# Altium footprint library ref-packages-longpad.PCBLIB: 1527 footprints (part 75 of 103) (continued)
## SQFP-S-7X7-72 [mm]
pads (72):
  rect 0.17x1.6 smd: 1(-2.55,-4.1) 2(-2.25,-4.1) 3(-1.95,-4.1) 4(-1.65,-4.1) 5(-1.35,-4.1) 6(-1.05,-4.1) 7(-0.75,-4.1) 8(-0.45,-4.1) 9(-0.15,-4.1) 10(0.15,-4.1) 11(0.45,-4.1) 12(0.75,-4.1) 13(1.05,-4.1) 14(1.35,-4.1) 15(1.65,-4.1) 16(1.95,-4.1) 17(2.25,-4.1) 18(2.55,-4.1) 37(2.55,4.1) 38(2.25,4.1) 39(1.95,4.1) 40(1.65,4.1) 41(1.35,4.1) 42(1.05,4.1) 43(0.75,4.1) 44(0.45,4.1) 45(0.15,4.1) 46(-0.15,4.1) 47(-0.45,4.1) 48(-0.75,4.1) 49(-1.05,4.1) 50(-1.35,4.1) 51(-1.65,4.1) 52(-1.95,4.1) 53(-2.25,4.1) 54(-2.55,4.1)
  rect 1.6x0.17 smd: 19(4.1,-2.55) 20(4.1,-2.25) 21(4.1,-1.95) 22(4.1,-1.65) 23(4.1,-1.35) 24(4.1,-1.05) 25(4.1,-0.75) 26(4.1,-0.45) 27(4.1,-0.15) 28(4.1,0.15) 29(4.1,0.45) 30(4.1,0.75) 31(4.1,1.05) 32(4.1,1.35) 33(4.1,1.65) 34(4.1,1.95) 35(4.1,2.25) 36(4.1,2.55) 55(-4.1,2.55) 56(-4.1,2.25) 57(-4.1,1.95) 58(-4.1,1.65) 59(-4.1,1.35) 60(-4.1,1.05) 61(-4.1,0.75) 62(-4.1,0.45) 63(-4.1,0.15) 64(-4.1,-0.15) 65(-4.1,-0.45) 66(-4.1,-0.75) 67(-4.1,-1.05) 68(-4.1,-1.35) 69(-4.1,-1.65) 70(-4.1,-1.95) 71(-4.1,-2.25) 72(-4.1,-2.55)
Top Overlay:
  circle w0.254: c-2.25,-2.25 r0.5
  lines w0.203: -3.2,-3.2 3.2,-3.2 3.2,3.2 -3.2,3.2 -3.2,-3.2
Mechanical 16:
  rectangle: -2.62,-4.6 -2.48,-3.45
  rectangle: -2.32,-4.6 -2.18,-3.45
  rectangle: -2.02,-4.6 -1.88,-3.45
  rectangle: -1.72,-4.6 -1.58,-3.45
  rectangle: -1.42,-4.6 -1.28,-3.45
  rectangle: -1.12,-4.6 -0.98,-3.45
  rectangle: -0.82,-4.6 -0.68,-3.45
  rectangle: -0.52,-4.6 -0.38,-3.45
  rectangle: -0.22,-4.6 -0.08,-3.45
  rectangle: 0.08,-4.6 0.22,-3.45
  rectangle: 0.38,-4.6 0.52,-3.45
  rectangle: 0.68,-4.6 0.82,-3.45
  rectangle: 0.98,-4.6 1.12,-3.45
  rectangle: 1.28,-4.6 1.42,-3.45
  rectangle: 1.58,-4.6 1.72,-3.45
  rectangle: 1.88,-4.6 2.02,-3.45
  rectangle: 2.18,-4.6 2.32,-3.45
  rectangle: 2.48,-4.6 2.62,-3.45
  rectangle: 3.45,-2.62 4.6,-2.48
  rectangle: 3.45,-2.32 4.6,-2.18
  rectangle: 3.45,-2.02 4.6,-1.88
  rectangle: 3.45,-1.72 4.6,-1.58
  rectangle: 3.45,-1.42 4.6,-1.28
  rectangle: 3.45,-1.12 4.6,-0.98
  rectangle: 3.45,-0.82 4.6,-0.68
  rectangle: 3.45,-0.52 4.6,-0.38
  rectangle: 3.45,-0.22 4.6,-0.08
  rectangle: 3.45,0.08 4.6,0.22
  rectangle: 3.45,0.38 4.6,0.52
  rectangle: 3.45,0.68 4.6,0.82
  rectangle: 3.45,0.98 4.6,1.12
  rectangle: 3.45,1.28 4.6,1.42
  rectangle: 3.45,1.58 4.6,1.72
  rectangle: 3.45,1.88 4.6,2.02
  rectangle: 3.45,2.18 4.6,2.32
  rectangle: 3.45,2.48 4.6,2.62
  rectangle: 2.48,3.45 2.62,4.6
  rectangle: 2.18,3.45 2.32,4.6
  rectangle: 1.88,3.45 2.02,4.6
  rectangle: 1.58,3.45 1.72,4.6
  rectangle: 1.28,3.45 1.42,4.6
  rectangle: 0.98,3.45 1.12,4.6
  rectangle: 0.68,3.45 0.82,4.6
  rectangle: 0.38,3.45 0.52,4.6
  rectangle: 0.08,3.45 0.22,4.6
  rectangle: -0.22,3.45 -0.08,4.6
  rectangle: -0.52,3.45 -0.38,4.6
  rectangle: -0.82,3.45 -0.68,4.6
  rectangle: -1.12,3.45 -0.98,4.6
  rectangle: -1.42,3.45 -1.28,4.6
  rectangle: -1.72,3.45 -1.58,4.6
  rectangle: -2.02,3.45 -1.88,4.6
  rectangle: -2.32,3.45 -2.18,4.6
  rectangle: -2.62,3.45 -2.48,4.6
  rectangle: -4.6,2.48 -3.45,2.62
  rectangle: -4.6,2.18 -3.45,2.32
  rectangle: -4.6,1.88 -3.45,2.02
  rectangle: -4.6,1.58 -3.45,1.72
  rectangle: -4.6,1.28 -3.45,1.42
  rectangle: -4.6,0.98 -3.45,1.12
  rectangle: -4.6,0.68 -3.45,0.82
  rectangle: -4.6,0.38 -3.45,0.52
  rectangle: -4.6,0.08 -3.45,0.22
  rectangle: -4.6,-0.22 -3.45,-0.08
  rectangle: -4.6,-0.52 -3.45,-0.38
  rectangle: -4.6,-0.82 -3.45,-0.68
  rectangle: -4.6,-1.12 -3.45,-0.98
  rectangle: -4.6,-1.42 -3.45,-1.28
  rectangle: -4.6,-1.72 -3.45,-1.58
  rectangle: -4.6,-2.02 -3.45,-1.88
  rectangle: -4.6,-2.32 -3.45,-2.18
  rectangle: -4.6,-2.62 -3.45,-2.48
  lines w0.203: -3.4,-3.4 3.4,-3.4 3.4,3.4 -3.4,3.4 -3.4,-3.4
Mechanical 27:
  lines w0.2: -5.4,-5.4 -5.4,5.4 5.4,5.4 5.4,-5.4 -5.4,-5.4

## SQFP-S-7X7-80 [mm]
pads (80):
  rect 0.17x1.6 smd: 1(-2.85,-4.1) 2(-2.55,-4.1) 3(-2.25,-4.1) 4(-1.95,-4.1) 5(-1.65,-4.1) 6(-1.35,-4.1) 7(-1.05,-4.1) 8(-0.75,-4.1) 9(-0.45,-4.1) 10(-0.15,-4.1) 11(0.15,-4.1) 12(0.45,-4.1) 13(0.75,-4.1) 14(1.05,-4.1) 15(1.35,-4.1) 16(1.65,-4.1) 17(1.95,-4.1) 18(2.25,-4.1) 19(2.55,-4.1) 20(2.85,-4.1) 41(2.85,4.1) 42(2.55,4.1) 43(2.25,4.1) 44(1.95,4.1) 45(1.65,4.1) 46(1.35,4.1) 47(1.05,4.1) 48(0.75,4.1) 49(0.45,4.1) 50(0.15,4.1) 51(-0.15,4.1) 52(-0.45,4.1) 53(-0.75,4.1) 54(-1.05,4.1) 55(-1.35,4.1) 56(-1.65,4.1) 57(-1.95,4.1) 58(-2.25,4.1) 59(-2.55,4.1) 60(-2.85,4.1)
  rect 1.6x0.17 smd: 21(4.1,-2.85) 22(4.1,-2.55) 23(4.1,-2.25) 24(4.1,-1.95) 25(4.1,-1.65) 26(4.1,-1.35) 27(4.1,-1.05) 28(4.1,-0.75) 29(4.1,-0.45) 30(4.1,-0.15) 31(4.1,0.15) 32(4.1,0.45) 33(4.1,0.75) 34(4.1,1.05) 35(4.1,1.35) 36(4.1,1.65) 37(4.1,1.95) 38(4.1,2.25) 39(4.1,2.55) 40(4.1,2.85) 61(-4.1,2.85) 62(-4.1,2.55) 63(-4.1,2.25) 64(-4.1,1.95) 65(-4.1,1.65) 66(-4.1,1.35) 67(-4.1,1.05) 68(-4.1,0.75) 69(-4.1,0.45) 70(-4.1,0.15) 71(-4.1,-0.15) 72(-4.1,-0.45) 73(-4.1,-0.75) 74(-4.1,-1.05) 75(-4.1,-1.35) 76(-4.1,-1.65) 77(-4.1,-1.95) 78(-4.1,-2.25) 79(-4.1,-2.55) 80(-4.1,-2.85)
Top Overlay:
  circle w0.254: c-2.25,-2.25 r0.5
  lines w0.203: -3.2,-3.2 3.2,-3.2 3.2,3.2 -3.2,3.2 -3.2,-3.2
Mechanical 16:
  rectangle: -2.92,-4.6 -2.78,-3.45
  rectangle: -2.62,-4.6 -2.48,-3.45
  rectangle: -2.32,-4.6 -2.18,-3.45
  rectangle: -2.02,-4.6 -1.88,-3.45
  rectangle: -1.72,-4.6 -1.58,-3.45
  rectangle: -1.42,-4.6 -1.28,-3.45
  rectangle: -1.12,-4.6 -0.98,-3.45
  rectangle: -0.82,-4.6 -0.68,-3.45
  rectangle: -0.52,-4.6 -0.38,-3.45
  rectangle: -0.22,-4.6 -0.08,-3.45
  rectangle: 0.08,-4.6 0.22,-3.45
  rectangle: 0.38,-4.6 0.52,-3.45
  rectangle: 0.68,-4.6 0.82,-3.45
  rectangle: 0.98,-4.6 1.12,-3.45
  rectangle: 1.28,-4.6 1.42,-3.45
  rectangle: 1.58,-4.6 1.72,-3.45
  rectangle: 1.88,-4.6 2.02,-3.45
  rectangle: 2.18,-4.6 2.32,-3.45
  rectangle: 2.48,-4.6 2.62,-3.45
  rectangle: 2.78,-4.6 2.92,-3.45
  rectangle: 3.45,-2.92 4.6,-2.78
  rectangle: 3.45,-2.62 4.6,-2.48
  rectangle: 3.45,-2.32 4.6,-2.18
  rectangle: 3.45,-2.02 4.6,-1.88
  rectangle: 3.45,-1.72 4.6,-1.58
  rectangle: 3.45,-1.42 4.6,-1.28
  rectangle: 3.45,-1.12 4.6,-0.98
  rectangle: 3.45,-0.82 4.6,-0.68
  rectangle: 3.45,-0.52 4.6,-0.38
  rectangle: 3.45,-0.22 4.6,-0.08
  rectangle: 3.45,0.08 4.6,0.22
  rectangle: 3.45,0.38 4.6,0.52
  rectangle: 3.45,0.68 4.6,0.82
  rectangle: 3.45,0.98 4.6,1.12
  rectangle: 3.45,1.28 4.6,1.42
  rectangle: 3.45,1.58 4.6,1.72
  rectangle: 3.45,1.88 4.6,2.02
  rectangle: 3.45,2.18 4.6,2.32
  rectangle: 3.45,2.48 4.6,2.62
  rectangle: 3.45,2.78 4.6,2.92
  rectangle: 2.78,3.45 2.92,4.6
  rectangle: 2.48,3.45 2.62,4.6
  rectangle: 2.18,3.45 2.32,4.6
  rectangle: 1.88,3.45 2.02,4.6
  rectangle: 1.58,3.45 1.72,4.6
  rectangle: 1.28,3.45 1.42,4.6
  rectangle: 0.98,3.45 1.12,4.6
  rectangle: 0.68,3.45 0.82,4.6
  rectangle: 0.38,3.45 0.52,4.6
  rectangle: 0.08,3.45 0.22,4.6
  rectangle: -0.22,3.45 -0.08,4.6
  rectangle: -0.52,3.45 -0.38,4.6
  rectangle: -0.82,3.45 -0.68,4.6
  rectangle: -1.12,3.45 -0.98,4.6
  rectangle: -1.42,3.45 -1.28,4.6
  rectangle: -1.72,3.45 -1.58,4.6
  rectangle: -2.02,3.45 -1.88,4.6
  rectangle: -2.32,3.45 -2.18,4.6
  rectangle: -2.62,3.45 -2.48,4.6
  rectangle: -2.92,3.45 -2.78,4.6
  rectangle: -4.6,2.78 -3.45,2.92
  rectangle: -4.6,2.48 -3.45,2.62
  rectangle: -4.6,2.18 -3.45,2.32
  rectangle: -4.6,1.88 -3.45,2.02
  rectangle: -4.6,1.58 -3.45,1.72
  rectangle: -4.6,1.28 -3.45,1.42
  rectangle: -4.6,0.98 -3.45,1.12
  rectangle: -4.6,0.68 -3.45,0.82
  rectangle: -4.6,0.38 -3.45,0.52
  rectangle: -4.6,0.08 -3.45,0.22
  rectangle: -4.6,-0.22 -3.45,-0.08
  rectangle: -4.6,-0.52 -3.45,-0.38
  rectangle: -4.6,-0.82 -3.45,-0.68
  rectangle: -4.6,-1.12 -3.45,-0.98
  rectangle: -4.6,-1.42 -3.45,-1.28
  rectangle: -4.6,-1.72 -3.45,-1.58
  rectangle: -4.6,-2.02 -3.45,-1.88
  rectangle: -4.6,-2.32 -3.45,-2.18
  rectangle: -4.6,-2.62 -3.45,-2.48
  rectangle: -4.6,-2.92 -3.45,-2.78
  lines w0.203: -3.4,-3.4 3.4,-3.4 3.4,3.4 -3.4,3.4 -3.4,-3.4
Mechanical 27:
  lines w0.2: -5.4,-5.4 -5.4,5.4 5.4,5.4 5.4,-5.4 -5.4,-5.4

## SQFP-S-10X10-44 [mm]
pads (44):
  rect 0.5x1.8 smd: 1(-4,-6) 2(-3.2,-6) 3(-2.4,-6) 4(-1.6,-6) 5(-0.8,-6) 6(0,-6) 7(0.8,-6) 8(1.6,-6) 9(2.4,-6) 10(3.2,-6) 11(4,-6) 23(4,6) 24(3.2,6) 25(2.4,6) 26(1.6,6) 27(0.8,6) 28(0,6) 29(-0.8,6) 30(-1.6,6) 31(-2.4,6) 32(-3.2,6) 33(-4,6)
  rect 1.8x0.5 smd: 12(6,-4) 13(6,-3.2) 14(6,-2.4) 15(6,-1.6) 16(6,-0.8) 17(6,0) 18(6,0.8) 19(6,1.6) 20(6,2.4) 21(6,3.2) 22(6,4) 34(-6,4) 35(-6,3.2) 36(-6,2.4) 37(-6,1.6) 38(-6,0.8) 39(-6,0) 40(-6,-0.8) 41(-6,-1.6) 42(-6,-2.4) 43(-6,-3.2) 44(-6,-4)
Top Overlay:
  circle w0.254: c-3.75,-3.75 r0.5
  lines w0.203: -4.72,-4.71 4.71,-4.71 4.71,4.71 -4.72,4.71 -4.72,-4.71
Mechanical 16:
  rectangle: -4.22,-6.72 -3.78,-4.95
  rectangle: -3.42,-6.72 -2.98,-4.95
  rectangle: -2.62,-6.72 -2.18,-4.95
  rectangle: -1.82,-6.72 -1.38,-4.95
  rectangle: -1.02,-6.72 -0.58,-4.95
  rectangle: -0.22,-6.72 0.22,-4.95
  rectangle: 0.58,-6.72 1.02,-4.95
  rectangle: 1.38,-6.72 1.82,-4.95
  rectangle: 2.18,-6.72 2.62,-4.95
  rectangle: 2.98,-6.72 3.42,-4.95
  rectangle: 3.78,-6.72 4.22,-4.95
  rectangle: 4.95,-4.22 6.72,-3.78
  rectangle: 4.95,-3.42 6.72,-2.98
  rectangle: 4.95,-2.62 6.72,-2.18
  rectangle: 4.95,-1.82 6.72,-1.38
  rectangle: 4.95,-1.02 6.72,-0.58
  rectangle: 4.95,-0.22 6.72,0.22
  rectangle: 4.95,0.58 6.72,1.02
  rectangle: 4.95,1.38 6.72,1.82
  rectangle: 4.95,2.18 6.72,2.62
  rectangle: 4.95,2.98 6.72,3.42
  rectangle: 4.95,3.78 6.72,4.22
  rectangle: 3.78,4.95 4.22,6.72
  rectangle: 2.98,4.95 3.42,6.72
  rectangle: 2.18,4.95 2.62,6.72
  rectangle: 1.38,4.95 1.82,6.72
  rectangle: 0.58,4.95 1.02,6.72
  rectangle: -0.22,4.95 0.22,6.72
  rectangle: -1.02,4.95 -0.58,6.72
  rectangle: -1.82,4.95 -1.38,6.72
  rectangle: -2.62,4.95 -2.18,6.72
  rectangle: -3.42,4.95 -2.98,6.72
  rectangle: -4.22,4.95 -3.78,6.72
  rectangle: -6.72,3.78 -4.95,4.22
  rectangle: -6.72,2.98 -4.95,3.42
  rectangle: -6.72,2.18 -4.95,2.62
  rectangle: -6.72,1.38 -4.95,1.82
  rectangle: -6.72,0.58 -4.95,1.02
  rectangle: -6.72,-0.22 -4.95,0.22
  rectangle: -6.72,-1.02 -4.95,-0.58
  rectangle: -6.72,-1.82 -4.95,-1.38
  rectangle: -6.72,-2.62 -4.95,-2.18
  rectangle: -6.72,-3.42 -4.95,-2.98
  rectangle: -6.72,-4.22 -4.95,-3.78
  lines w0.203: -4.91,-4.91 4.91,-4.91 4.91,4.91 -4.91,4.91 -4.91,-4.91
Mechanical 27:
  lines w0.2: -7.4,-7.4 -7.4,7.4 7.4,7.4 7.4,-7.4 -7.4,-7.4

## SQFP-S-10X10-52 [mm]
pads (52):
  rect 0.4x1.8 smd: 1(-3.9,-6) 2(-3.25,-6) 3(-2.6,-6) 4(-1.95,-6) 5(-1.3,-6) 6(-0.65,-6) 7(0,-6) 8(0.65,-6) 9(1.3,-6) 10(1.95,-6) 11(2.6,-6) 12(3.25,-6) 13(3.9,-6) 27(3.9,6) 28(3.25,6) 29(2.6,6) 30(1.95,6) 31(1.3,6) 32(0.65,6) 33(0,6) 34(-0.65,6) 35(-1.3,6) 36(-1.95,6) 37(-2.6,6) 38(-3.25,6) 39(-3.9,6)
  rect 1.8x0.4 smd: 14(6,-3.9) 15(6,-3.25) 16(6,-2.6) 17(6,-1.95) 18(6,-1.3) 19(6,-0.65) 20(6,0) 21(6,0.65) 22(6,1.3) 23(6,1.95) 24(6,2.6) 25(6,3.25) 26(6,3.9) 40(-6,3.9) 41(-6,3.25) 42(-6,2.6) 43(-6,1.95) 44(-6,1.3) 45(-6,0.65) 46(-6,0) 47(-6,-0.65) 48(-6,-1.3) 49(-6,-1.95) 50(-6,-2.6) 51(-6,-3.25) 52(-6,-3.9)
Top Overlay:
  circle w0.254: c-3.75,-3.75 r0.5
  lines w0.203: -4.72,-4.71 4.71,-4.71 4.71,4.71 -4.72,4.71 -4.72,-4.71
Mechanical 16:
  rectangle: -4.09,-6.72 -3.71,-4.95
  rectangle: -3.44,-6.72 -3.06,-4.95
  rectangle: -2.79,-6.72 -2.41,-4.95
  rectangle: -2.14,-6.72 -1.76,-4.95
  rectangle: -1.49,-6.72 -1.11,-4.95
  rectangle: -0.84,-6.72 -0.46,-4.95
  rectangle: -0.19,-6.72 0.19,-4.95
  rectangle: 0.46,-6.72 0.84,-4.95
  rectangle: 1.11,-6.72 1.49,-4.95
  rectangle: 1.76,-6.72 2.14,-4.95
  rectangle: 2.41,-6.72 2.79,-4.95
  rectangle: 3.06,-6.72 3.44,-4.95
  rectangle: 3.71,-6.72 4.09,-4.95
  rectangle: 4.95,-4.09 6.72,-3.71
  rectangle: 4.95,-3.44 6.72,-3.06
  rectangle: 4.95,-2.79 6.72,-2.41
  rectangle: 4.95,-2.14 6.72,-1.76
  rectangle: 4.95,-1.49 6.72,-1.11
  rectangle: 4.95,-0.84 6.72,-0.46
  rectangle: 4.95,-0.19 6.72,0.19
  rectangle: 4.95,0.46 6.72,0.84
  rectangle: 4.95,1.11 6.72,1.49
  rectangle: 4.95,1.76 6.72,2.14
  rectangle: 4.95,2.41 6.72,2.79
  rectangle: 4.95,3.06 6.72,3.44
  rectangle: 4.95,3.71 6.72,4.09
  rectangle: 3.71,4.95 4.09,6.72
  rectangle: 3.06,4.95 3.44,6.72
  rectangle: 2.41,4.95 2.79,6.72
  rectangle: 1.76,4.95 2.14,6.72
  rectangle: 1.11,4.95 1.49,6.72
  rectangle: 0.46,4.95 0.84,6.72
  rectangle: -0.19,4.95 0.19,6.72
  rectangle: -0.84,4.95 -0.46,6.72
  rectangle: -1.49,4.95 -1.11,6.72
  rectangle: -2.14,4.95 -1.76,6.72
  rectangle: -2.79,4.95 -2.41,6.72
  rectangle: -3.44,4.95 -3.06,6.72
  rectangle: -4.09,4.95 -3.71,6.72
  rectangle: -6.72,3.71 -4.95,4.09
  rectangle: -6.72,3.06 -4.95,3.44
  rectangle: -6.72,2.41 -4.95,2.79
  rectangle: -6.72,1.76 -4.95,2.14
  rectangle: -6.72,1.11 -4.95,1.49
  rectangle: -6.72,0.46 -4.95,0.84
  rectangle: -6.72,-0.19 -4.95,0.19
  rectangle: -6.72,-0.84 -4.95,-0.46
  rectangle: -6.72,-1.49 -4.95,-1.11
  rectangle: -6.72,-2.14 -4.95,-1.76
  rectangle: -6.72,-2.79 -4.95,-2.41
  rectangle: -6.72,-3.44 -4.95,-3.06
  rectangle: -6.72,-4.09 -4.95,-3.71
  lines w0.203: -4.91,-4.91 4.91,-4.91 4.91,4.91 -4.91,4.91 -4.91,-4.91
Mechanical 27:
  lines w0.2: -7.4,-7.4 -7.4,7.4 7.4,7.4 7.4,-7.4 -7.4,-7.4

## SQFP-S-10X10-64 [mil]
pads (64):
  rect 11.81x62.99 smd: 1(-147.64,-220.47) 2(-127.95,-220.47) 3(-108.27,-220.47) 4(-88.58,-220.47) 5(-68.9,-220.47) 6(-49.21,-220.47) 7(-29.53,-220.47) 8(-9.84,-220.47) 9(9.84,-220.47) 10(29.53,-220.47) 11(49.21,-220.47) 12(68.9,-220.47) 13(88.58,-220.47) 14(108.27,-220.47) 15(127.95,-220.47) 16(147.64,-220.47) 33(147.64,220.47) 34(127.95,220.47) 35(108.27,220.47) 36(88.58,220.47) 37(68.9,220.47) 38(49.21,220.47) 39(29.53,220.47) 40(9.84,220.47) 41(-9.84,220.47) 42(-29.53,220.47) 43(-49.21,220.47) 44(-68.9,220.47) 45(-88.58,220.47) 46(-108.27,220.47) 47(-127.95,220.47) 48(-147.64,220.47)
  rect 62.99x11.81 smd: 17(220.47,-147.64) 18(220.47,-127.95) 19(220.47,-108.27) 20(220.47,-88.58) 21(220.47,-68.9) 22(220.47,-49.21) 23(220.47,-29.53) 24(220.47,-9.84) 25(220.47,9.84) 26(220.47,29.53) 27(220.47,49.21) 28(220.47,68.9) 29(220.47,88.58) 30(220.47,108.27) 31(220.47,127.95) 32(220.47,147.64) 49(-220.47,147.64) 50(-220.47,127.95) 51(-220.47,108.27) 52(-220.47,88.58) 53(-220.47,68.9) 54(-220.47,49.21) 55(-220.47,29.53) 56(-220.47,9.84) 57(-220.47,-9.84) 58(-220.47,-29.53) 59(-220.47,-49.21) 60(-220.47,-68.9) 61(-220.47,-88.58) 62(-220.47,-108.27) 63(-220.47,-127.95) 64(-220.47,-147.64)
Top Overlay:
  circle w10: c-147.64,-147.64 r19.69
  lines w8: -185.83,-185.43 185.43,-185.43 185.43,185.43 -185.83,185.43 -185.83,-185.43
Mechanical 16:
  rectangle: -153.54,-232.28 -141.73,-194.88
  rectangle: -133.86,-232.28 -122.05,-194.88
  rectangle: -114.17,-232.28 -102.36,-194.88
  rectangle: -94.49,-232.28 -82.68,-194.88
  rectangle: -74.8,-232.28 -62.99,-194.88
  rectangle: -55.12,-232.28 -43.31,-194.88
  rectangle: -35.43,-232.28 -23.62,-194.88
  rectangle: -15.75,-232.28 -3.94,-194.88
  rectangle: 3.94,-232.28 15.75,-194.88
  rectangle: 23.62,-232.28 35.43,-194.88
  rectangle: 43.31,-232.28 55.12,-194.88
  rectangle: 62.99,-232.28 74.8,-194.88
  rectangle: 82.68,-232.28 94.49,-194.88
  rectangle: 102.36,-232.28 114.17,-194.88
  rectangle: 122.05,-232.28 133.86,-194.88
  rectangle: 141.73,-232.28 153.54,-194.88
  rectangle: 194.88,-153.54 232.28,-141.73
  rectangle: 194.88,-133.86 232.28,-122.05
  rectangle: 194.88,-114.17 232.28,-102.36
  rectangle: 194.88,-94.49 232.28,-82.68
  rectangle: 194.88,-74.8 232.28,-62.99
  rectangle: 194.88,-55.12 232.28,-43.31
  rectangle: 194.88,-35.43 232.28,-23.62
  rectangle: 194.88,-15.75 232.28,-3.94
  rectangle: 194.88,3.94 232.28,15.75
  rectangle: 194.88,23.62 232.28,35.43
  rectangle: 194.88,43.31 232.28,55.12
  rectangle: 194.88,62.99 232.28,74.8
  rectangle: 194.88,82.68 232.28,94.49
  rectangle: 194.88,102.36 232.28,114.17
  rectangle: 194.88,122.05 232.28,133.86
  rectangle: 194.88,141.73 232.28,153.54
  rectangle: 141.73,194.88 153.54,232.28
  rectangle: 122.05,194.88 133.86,232.28
  rectangle: 102.36,194.88 114.17,232.28
  rectangle: 82.68,194.88 94.49,232.28
  rectangle: 62.99,194.88 74.8,232.28
  rectangle: 43.31,194.88 55.12,232.28
  rectangle: 23.62,194.88 35.43,232.28
  rectangle: 3.94,194.88 15.75,232.28
  rectangle: -15.75,194.88 -3.94,232.28
  rectangle: -35.43,194.88 -23.62,232.28
  rectangle: -55.12,194.88 -43.31,232.28
  rectangle: -74.8,194.88 -62.99,232.28
  rectangle: -94.49,194.88 -82.68,232.28
  rectangle: -114.17,194.88 -102.36,232.28
  rectangle: -133.86,194.88 -122.05,232.28
  rectangle: -153.54,194.88 -141.73,232.28
  rectangle: -232.28,141.73 -194.88,153.54
  rectangle: -232.28,122.05 -194.88,133.86
  rectangle: -232.28,102.36 -194.88,114.17
  rectangle: -232.28,82.68 -194.88,94.49
  rectangle: -232.28,62.99 -194.88,74.8
  rectangle: -232.28,43.31 -194.88,55.12
  rectangle: -232.28,23.62 -194.88,35.43
  rectangle: -232.28,3.94 -194.88,15.75
  rectangle: -232.28,-15.75 -194.88,-3.94
  rectangle: -232.28,-35.43 -194.88,-23.62
  rectangle: -232.28,-55.12 -194.88,-43.31
  rectangle: -232.28,-74.8 -194.88,-62.99
  rectangle: -232.28,-94.49 -194.88,-82.68
  rectangle: -232.28,-114.17 -194.88,-102.36
  rectangle: -232.28,-133.86 -194.88,-122.05
  rectangle: -232.28,-153.54 -194.88,-141.73
  lines w8: -193.31,-193.31 193.31,-193.31 193.31,193.31 -193.31,193.31 -193.31,-193.31
Mechanical 27:
  lines w7.87: -271.65,-271.65 -271.65,271.65 271.65,271.65 271.65,-271.65 -271.65,-271.65

## SQFP-S-10X10-72 [mil]
pads (72):
  rect 11.81x62.99 smd: 1(-167.32,-220.47) 2(-147.64,-220.47) 3(-127.95,-220.47) 4(-108.27,-220.47) 5(-88.58,-220.47) 6(-68.9,-220.47) 7(-49.21,-220.47) 8(-29.53,-220.47) 9(-9.84,-220.47) 10(9.84,-220.47) 11(29.53,-220.47) 12(49.21,-220.47) 13(68.9,-220.47) 14(88.58,-220.47) 15(108.27,-220.47) 16(127.95,-220.47) 17(147.64,-220.47) 18(167.32,-220.47) 37(167.32,220.47) 38(147.64,220.47) 39(127.95,220.47) 40(108.27,220.47) 41(88.58,220.47) 42(68.9,220.47) 43(49.21,220.47) 44(29.53,220.47) 45(9.84,220.47) 46(-9.84,220.47) 47(-29.53,220.47) 48(-49.21,220.47) 49(-68.9,220.47) 50(-88.58,220.47) 51(-108.27,220.47) 52(-127.95,220.47) 53(-147.64,220.47) 54(-167.32,220.47)
  rect 62.99x11.81 smd: 19(220.47,-167.32) 20(220.47,-147.64) 21(220.47,-127.95) 22(220.47,-108.27) 23(220.47,-88.58) 24(220.47,-68.9) 25(220.47,-49.21) 26(220.47,-29.53) 27(220.47,-9.84) 28(220.47,9.84) 29(220.47,29.53) 30(220.47,49.21) 31(220.47,68.9) 32(220.47,88.58) 33(220.47,108.27) 34(220.47,127.95) 35(220.47,147.64) 36(220.47,167.32) 55(-220.47,167.32) 56(-220.47,147.64) 57(-220.47,127.95) 58(-220.47,108.27) 59(-220.47,88.58) 60(-220.47,68.9) 61(-220.47,49.21) 62(-220.47,29.53) 63(-220.47,9.84) 64(-220.47,-9.84) 65(-220.47,-29.53) 66(-220.47,-49.21) 67(-220.47,-68.9) 68(-220.47,-88.58) 69(-220.47,-108.27) 70(-220.47,-127.95) 71(-220.47,-147.64) 72(-220.47,-167.32)
Top Overlay:
  circle w10: c-147.64,-147.64 r19.69
  lines w8: -185.83,-185.43 185.43,-185.43 185.43,185.43 -185.83,185.43 -185.83,-185.43
Mechanical 16:
  rectangle: -173.23,-232.28 -161.42,-194.88
  rectangle: -153.54,-232.28 -141.73,-194.88
  rectangle: -133.86,-232.28 -122.05,-194.88
  rectangle: -114.17,-232.28 -102.36,-194.88
  rectangle: -94.49,-232.28 -82.68,-194.88
  rectangle: -74.8,-232.28 -62.99,-194.88
  rectangle: -55.12,-232.28 -43.31,-194.88
  rectangle: -35.43,-232.28 -23.62,-194.88
  rectangle: -15.75,-232.28 -3.94,-194.88
  rectangle: 3.94,-232.28 15.75,-194.88
  rectangle: 23.62,-232.28 35.43,-194.88
  rectangle: 43.31,-232.28 55.12,-194.88
  rectangle: 62.99,-232.28 74.8,-194.88
  rectangle: 82.68,-232.28 94.49,-194.88
  rectangle: 102.36,-232.28 114.17,-194.88
  rectangle: 122.05,-232.28 133.86,-194.88
  rectangle: 141.73,-232.28 153.54,-194.88
  rectangle: 161.42,-232.28 173.23,-194.88
  rectangle: 194.88,-173.23 232.28,-161.42
  rectangle: 194.88,-153.54 232.28,-141.73
  rectangle: 194.88,-133.86 232.28,-122.05
  rectangle: 194.88,-114.17 232.28,-102.36
  rectangle: 194.88,-94.49 232.28,-82.68
  rectangle: 194.88,-74.8 232.28,-62.99
  rectangle: 194.88,-55.12 232.28,-43.31
  rectangle: 194.88,-35.43 232.28,-23.62
  rectangle: 194.88,-15.75 232.28,-3.94
  rectangle: 194.88,3.94 232.28,15.75
  rectangle: 194.88,23.62 232.28,35.43
  rectangle: 194.88,43.31 232.28,55.12
  rectangle: 194.88,62.99 232.28,74.8
  rectangle: 194.88,82.68 232.28,94.49
  rectangle: 194.88,102.36 232.28,114.17
  rectangle: 194.88,122.05 232.28,133.86
  rectangle: 194.88,141.73 232.28,153.54
  rectangle: 194.88,161.42 232.28,173.23
  rectangle: 161.42,194.88 173.23,232.28
  rectangle: 141.73,194.88 153.54,232.28
  rectangle: 122.05,194.88 133.86,232.28
  rectangle: 102.36,194.88 114.17,232.28
  rectangle: 82.68,194.88 94.49,232.28
  rectangle: 62.99,194.88 74.8,232.28
  rectangle: 43.31,194.88 55.12,232.28
  rectangle: 23.62,194.88 35.43,232.28
  rectangle: 3.94,194.88 15.75,232.28
  rectangle: -15.75,194.88 -3.94,232.28
  rectangle: -35.43,194.88 -23.62,232.28
  rectangle: -55.12,194.88 -43.31,232.28
  rectangle: -74.8,194.88 -62.99,232.28
  rectangle: -94.49,194.88 -82.68,232.28
  rectangle: -114.17,194.88 -102.36,232.28
  rectangle: -133.86,194.88 -122.05,232.28
  rectangle: -153.54,194.88 -141.73,232.28
  rectangle: -173.23,194.88 -161.42,232.28
  rectangle: -232.28,161.42 -194.88,173.23
  rectangle: -232.28,141.73 -194.88,153.54
  rectangle: -232.28,122.05 -194.88,133.86
  rectangle: -232.28,102.36 -194.88,114.17
  rectangle: -232.28,82.68 -194.88,94.49
  rectangle: -232.28,62.99 -194.88,74.8
  rectangle: -232.28,43.31 -194.88,55.12
  rectangle: -232.28,23.62 -194.88,35.43
  rectangle: -232.28,3.94 -194.88,15.75
  rectangle: -232.28,-15.75 -194.88,-3.94
  rectangle: -232.28,-35.43 -194.88,-23.62
  rectangle: -232.28,-55.12 -194.88,-43.31
  rectangle: -232.28,-74.8 -194.88,-62.99
  rectangle: -232.28,-94.49 -194.88,-82.68
  rectangle: -232.28,-114.17 -194.88,-102.36
  rectangle: -232.28,-133.86 -194.88,-122.05
  rectangle: -232.28,-153.54 -194.88,-141.73
  rectangle: -232.28,-173.23 -194.88,-161.42
  lines w8: -193.31,-193.31 193.31,-193.31 193.31,193.31 -193.31,193.31 -193.31,-193.31
Mechanical 27:
  lines w7.87: -271.65,-271.65 -271.65,271.65 271.65,271.65 271.65,-271.65 -271.65,-271.65

## SQFP-S-10X10-80 [mm]
pads (80):
  rect 0.25x1.6 smd: 1(-3.8,-5.6) 2(-3.4,-5.6) 3(-3,-5.6) 4(-2.6,-5.6) 5(-2.2,-5.6) 6(-1.8,-5.6) 7(-1.4,-5.6) 8(-1,-5.6) 9(-0.6,-5.6) 10(-0.2,-5.6) 11(0.2,-5.6) 12(0.6,-5.6) 13(1,-5.6) 14(1.4,-5.6) 15(1.8,-5.6) 16(2.2,-5.6) 17(2.6,-5.6) 18(3,-5.6) 19(3.4,-5.6) 20(3.8,-5.6) 41(3.8,5.6) 42(3.4,5.6) 43(3,5.6) 44(2.6,5.6) 45(2.2,5.6) 46(1.8,5.6) 47(1.4,5.6) 48(1,5.6) 49(0.6,5.6) 50(0.2,5.6) 51(-0.2,5.6) 52(-0.6,5.6) 53(-1,5.6) 54(-1.4,5.6) 55(-1.8,5.6) 56(-2.2,5.6) 57(-2.6,5.6) 58(-3,5.6) 59(-3.4,5.6) 60(-3.8,5.6)
  rect 1.6x0.25 smd: 21(5.6,-3.8) 22(5.6,-3.4) 23(5.6,-3) 24(5.6,-2.6) 25(5.6,-2.2) 26(5.6,-1.8) 27(5.6,-1.4) 28(5.6,-1) 29(5.6,-0.6) 30(5.6,-0.2) 31(5.6,0.2) 32(5.6,0.6) 33(5.6,1) 34(5.6,1.4) 35(5.6,1.8) 36(5.6,2.2) 37(5.6,2.6) 38(5.6,3) 39(5.6,3.4) 40(5.6,3.8) 61(-5.6,3.8) 62(-5.6,3.4) 63(-5.6,3) 64(-5.6,2.6) 65(-5.6,2.2) 66(-5.6,1.8) 67(-5.6,1.4) 68(-5.6,1) 69(-5.6,0.6) 70(-5.6,0.2) 71(-5.6,-0.2) 72(-5.6,-0.6) 73(-5.6,-1) 74(-5.6,-1.4) 75(-5.6,-1.8) 76(-5.6,-2.2) 77(-5.6,-2.6) 78(-5.6,-3) 79(-5.6,-3.4) 80(-5.6,-3.8)
Top Overlay:
  circle w0.203: c-3.675,-4.1 r0.3
  lines w0.203: -4.72,-4.71 4.71,-4.71 4.71,4.71 -4.72,4.71 -4.72,-4.71
Mechanical 16:
  rectangle: -3.91,-5.9 -3.69,-4.95
  rectangle: -3.51,-5.9 -3.29,-4.95
  rectangle: -3.11,-5.9 -2.89,-4.95
  rectangle: -2.71,-5.9 -2.49,-4.95
  rectangle: -2.31,-5.9 -2.09,-4.95
  rectangle: -1.91,-5.9 -1.69,-4.95
  rectangle: -1.51,-5.9 -1.29,-4.95
  rectangle: -1.11,-5.9 -0.89,-4.95
  rectangle: -0.71,-5.9 -0.49,-4.95
  rectangle: -0.31,-5.9 -0.09,-4.95
  rectangle: 0.09,-5.9 0.31,-4.95
  rectangle: 0.49,-5.9 0.71,-4.95
  rectangle: 0.89,-5.9 1.11,-4.95
  rectangle: 1.29,-5.9 1.51,-4.95
  rectangle: 1.69,-5.9 1.91,-4.95
  rectangle: 2.09,-5.9 2.31,-4.95
  rectangle: 2.49,-5.9 2.71,-4.95
  rectangle: 2.89,-5.9 3.11,-4.95
  rectangle: 3.29,-5.9 3.51,-4.95
  rectangle: 3.69,-5.9 3.91,-4.95
  rectangle: 4.95,-3.91 5.9,-3.69
  rectangle: 4.95,-3.51 5.9,-3.29
  rectangle: 4.95,-3.11 5.9,-2.89
  rectangle: 4.95,-2.71 5.9,-2.49
  rectangle: 4.95,-2.31 5.9,-2.09
  rectangle: 4.95,-1.91 5.9,-1.69
  rectangle: 4.95,-1.51 5.9,-1.29
  rectangle: 4.95,-1.11 5.9,-0.89
  rectangle: 4.95,-0.71 5.9,-0.49
  rectangle: 4.95,-0.31 5.9,-0.09
  rectangle: 4.95,0.09 5.9,0.31
  rectangle: 4.95,0.49 5.9,0.71
  rectangle: 4.95,0.89 5.9,1.11
  rectangle: 4.95,1.29 5.9,1.51
  rectangle: 4.95,1.69 5.9,1.91
  rectangle: 4.95,2.09 5.9,2.31
  rectangle: 4.95,2.49 5.9,2.71
  rectangle: 4.95,2.89 5.9,3.11
  rectangle: 4.95,3.29 5.9,3.51
  rectangle: 4.95,3.69 5.9,3.91
  rectangle: 3.69,4.95 3.91,5.9
  rectangle: 3.29,4.95 3.51,5.9
  rectangle: 2.89,4.95 3.11,5.9
  rectangle: 2.49,4.95 2.71,5.9
  rectangle: 2.09,4.95 2.31,5.9
  rectangle: 1.69,4.95 1.91,5.9
  rectangle: 1.29,4.95 1.51,5.9
  rectangle: 0.89,4.95 1.11,5.9
  rectangle: 0.49,4.95 0.71,5.9
  rectangle: 0.09,4.95 0.31,5.9
  rectangle: -0.31,4.95 -0.09,5.9
  rectangle: -0.71,4.95 -0.49,5.9
  rectangle: -1.11,4.95 -0.89,5.9
  rectangle: -1.51,4.95 -1.29,5.9
  rectangle: -1.91,4.95 -1.69,5.9
  rectangle: -2.31,4.95 -2.09,5.9
  rectangle: -2.71,4.95 -2.49,5.9
  rectangle: -3.11,4.95 -2.89,5.9
  rectangle: -3.51,4.95 -3.29,5.9
  rectangle: -3.91,4.95 -3.69,5.9
  rectangle: -5.9,3.69 -4.95,3.91
  rectangle: -5.9,3.29 -4.95,3.51
  rectangle: -5.9,2.89 -4.95,3.11
  rectangle: -5.9,2.49 -4.95,2.71
  rectangle: -5.9,2.09 -4.95,2.31
  rectangle: -5.9,1.69 -4.95,1.91
  rectangle: -5.9,1.29 -4.95,1.51
  rectangle: -5.9,0.89 -4.95,1.11
  rectangle: -5.9,0.49 -4.95,0.71
  rectangle: -5.9,0.09 -4.95,0.31
  rectangle: -5.9,-0.31 -4.95,-0.09
  rectangle: -5.9,-0.71 -4.95,-0.49
  rectangle: -5.9,-1.11 -4.95,-0.89
  rectangle: -5.9,-1.51 -4.95,-1.29
  rectangle: -5.9,-1.91 -4.95,-1.69
  rectangle: -5.9,-2.31 -4.95,-2.09
  rectangle: -5.9,-2.71 -4.95,-2.49
  rectangle: -5.9,-3.11 -4.95,-2.89
  rectangle: -5.9,-3.51 -4.95,-3.29
  rectangle: -5.9,-3.91 -4.95,-3.69
  lines w0.203: -4.91,-4.91 4.91,-4.91 4.91,4.91 -4.91,4.91 -4.91,-4.91
Mechanical 27:
  lines w0.2: -6.9,-6.9 -6.9,6.9 6.9,6.9 6.9,-6.9 -6.9,-6.9